# Altium footprint library boxer_mechanical.PcbLib: 38 footprints (part 2 of 3)
Each footprint in its own frame and in the unit in brackets; x right, y up, seen from the top. Pads: shape width x height; smd on the part's side, far side on the other; paste and mask are expansions set on the pad; w line width, h text height; cw(c..) or ccw(c..) is an arc to the next point about the centre after c.
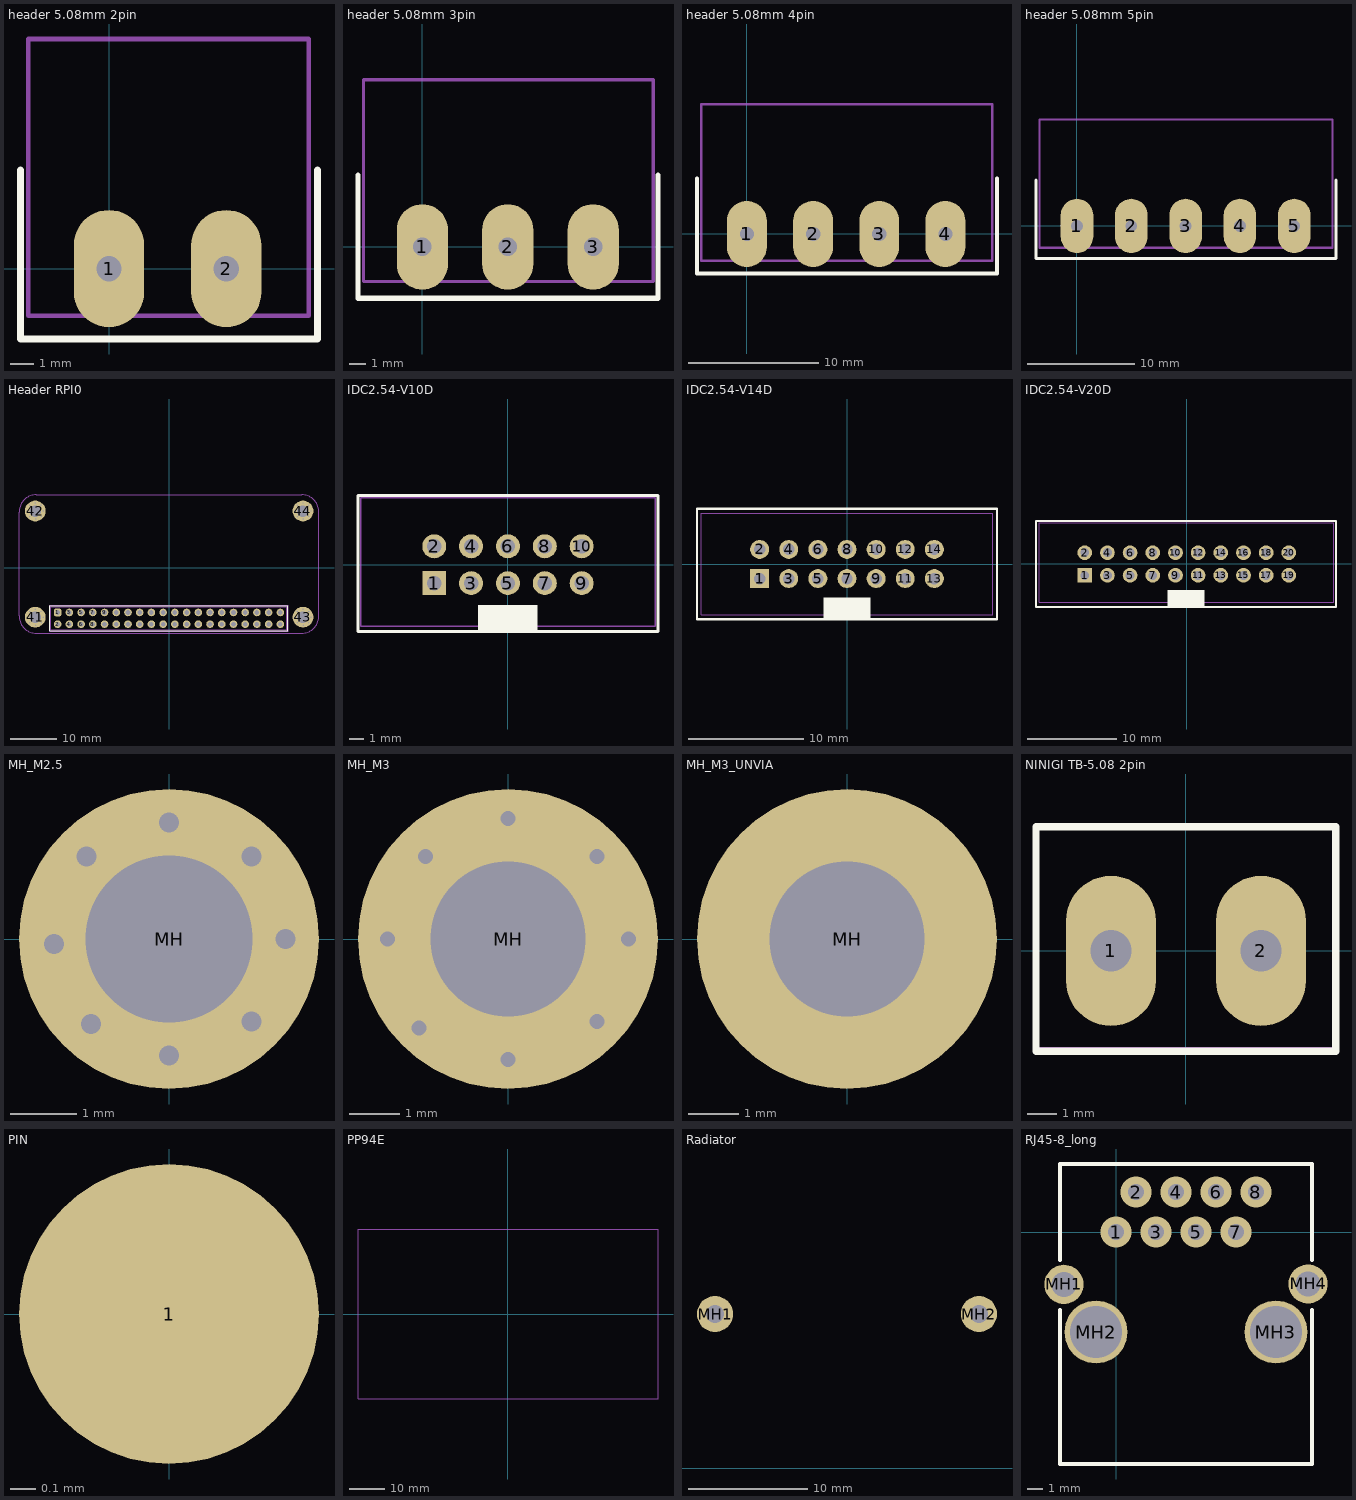
[diagram p1: the footprints below, top view; thin cyan lines are the x and y axes]

## header 5.08mm 2pin [mm]
height 7.8
pads (2):
  oval 3.048x5.08 hole 1.1: 1(0,0) 2(5.08,0)
Top Overlay:
  lines w0.3: -3.833,4.275 -3.833,-3.05 9.03,-3.05 9.03,4.275
Mechanical 13:
  lines w0.2: -3.503,-2.05 8.657,-2.05 8.657,9.95 -3.503,9.95 -3.503,-2.05
3D body "User Library-TB5_08-2R.step": height 8.55, standoff -4.1, extent -3.503,-2.05 8.657,9.95

## header 5.08mm 3pin [mm]
height 7.8
pads (3):
  oval 3.048x5.08 hole 1.1: 1(0,0) 2(5.08,0) 3(10.16,0)
Top Overlay:
  lines w0.254: -1.4,0 0,0 ; 10.16,0 11.56,0
  lines w0.3: -3.833,4.275 -3.833,-3.05 14.017,-3.05 14.017,4.275
Mechanical 13:
  lines w0.2: -3.503,-2.05 13.737,-2.05 13.737,9.95 -3.503,9.95 -3.503,-2.05
3D body "User Library-TB5_08-3R.step": height 8.55, standoff -4.1, extent -3.503,-2.05 13.737,9.95

## header 5.08mm 4pin [mm]
height 7.8
pads (4):
  oval 3.048x5.08 hole 1.1: 1(0,0) 2(5.08,0) 3(10.16,0) 4(15.24,0)
Top Overlay:
  lines w0.254: -1.4,0 0,0 ; 10.16,0 11.56,0
  lines w0.3: -3.833,4.275 -3.833,-3.05 19.2,-3.05 19.2,4.275
Mechanical 13:
  lines w0.2: -3.503,-2.05 18.825,-2.05 18.825,9.95 -3.503,9.95 -3.503,-2.05
3D body "User Library-TB5_08-4R.step": height 8.55, standoff -4.1, extent -3.503,-2.05 18.817,9.95

## header 5.08mm 5pin [mm]
height 7.8
pads (5):
  oval 3.048x5.08 hole 1.1: 1(0,0) 2(5.08,0) 3(10.16,0) 4(15.24,0) 5(20.32,0)
Top Overlay:
  lines w0.254: -1.4,0 0,0 ; 10.16,0 11.56,0
  lines w0.3: -3.833,4.275 -3.833,-3.05 24.225,-3.05 24.225,4.275
Mechanical 13:
  lines w0.2: -3.503,-2.05 23.897,-2.05 23.897,9.95 -3.503,9.95 -3.503,-2.05
3D body "User Library-TB5_08-5R.step": height 8.55, standoff -4.1, extent -3.503,-2.05 23.897,9.95

## Header RPI0 [mm]
height 9.45
pads (44):
  rrect50% 1.65x1.65 hole 1: 1(-24.153,-9.717)
  round 1.65 hole 1: 2(-24.153,-12.257) 3(-21.613,-9.717) 4(-21.613,-12.257) 5(-19.073,-9.717) 6(-19.073,-12.257) 7(-16.533,-9.717) 8(-16.533,-12.257) 9(-13.993,-9.717) 10(-13.993,-12.257) 11(-11.453,-9.717) 12(-11.453,-12.257) 13(-8.913,-9.717) 14(-8.913,-12.257) 15(-6.373,-9.717) 16(-6.373,-12.257) 17(-3.833,-9.717) 18(-3.833,-12.257) 19(-1.293,-9.717) 20(-1.293,-12.257) 21(1.247,-9.717) 22(1.247,-12.257) 23(3.787,-9.717) 24(3.787,-12.257) 25(6.327,-9.717) 26(6.327,-12.257) 27(8.867,-9.717) 28(8.867,-12.257) 29(11.407,-9.717) 30(11.407,-12.257) 31(13.947,-9.717) 32(13.947,-12.257) 33(16.487,-9.717) 34(16.487,-12.257) 35(19.027,-9.717) 36(19.027,-12.257) 37(21.567,-9.717) 38(21.567,-12.257) 39(24.107,-9.717) 40(24.107,-12.257)
  round 4.5 hole 2.5: 41(-29,-10.743) 42(-29,12.257) 43(29,-10.743) 44(29,12.257)
via -30.237,13.494 diameter 0.6 hole 0.3
via -27.727,11.09 diameter 0.6 hole 0.3
via -27.763,13.494 diameter 0.6 hole 0.3
via -30.237,11.019 diameter 0.6 hole 0.3
via -30.75,12.257 diameter 0.6 hole 0.3
via -27.25,12.257 diameter 0.6 hole 0.3
via -28.925,10.532 diameter 0.6 hole 0.3
via -29,14.007 diameter 0.6 hole 0.3
via 29,14.007 diameter 0.6 hole 0.3
via 29.075,10.532 diameter 0.6 hole 0.3
via 30.75,12.257 diameter 0.6 hole 0.3
via 27.25,12.257 diameter 0.6 hole 0.3
via 27.763,11.019 diameter 0.6 hole 0.3
via 30.237,13.494 diameter 0.6 hole 0.3
via 30.273,11.09 diameter 0.6 hole 0.3
via 27.763,13.494 diameter 0.6 hole 0.3
via -29,-8.993 diameter 0.6 hole 0.3
via -28.925,-12.468 diameter 0.6 hole 0.3
via -27.25,-10.743 diameter 0.6 hole 0.3
via -30.75,-10.743 diameter 0.6 hole 0.3
via -30.237,-11.981 diameter 0.6 hole 0.3
via -27.763,-9.506 diameter 0.6 hole 0.3
via -27.727,-11.91 diameter 0.6 hole 0.3
via -30.237,-9.506 diameter 0.6 hole 0.3
via 27.763,-9.506 diameter 0.6 hole 0.3
via 30.273,-11.91 diameter 0.6 hole 0.3
via 30.237,-9.506 diameter 0.6 hole 0.3
via 27.763,-11.981 diameter 0.6 hole 0.3
via 27.25,-10.743 diameter 0.6 hole 0.3
via 30.75,-10.743 diameter 0.6 hole 0.3
via 29.075,-12.468 diameter 0.6 hole 0.3
via 29,-8.993 diameter 0.6 hole 0.3
Top Overlay:
  lines w0.2: -25.823,-13.687 25.702,-13.687 25.702,-8.287 -25.823,-8.287 -25.823,-13.687
Mechanical 1:
  lines w0.1: -32.525,-10.467 ccw(c-28.775,-10.467) -28.775,-14.217 28.725,-14.217 ccw(c28.725,-10.467) 32.475,-10.467 32.475,12.033 ccw(c28.725,12.033) 28.725,15.783 -28.775,15.783 ccw(c-28.775,12.033) -32.525,12.033 -32.525,-10.467
Mechanical 13:
  lines w0.1: -25.603,-13.487 25.497,-13.487 25.497,-8.487 -25.603,-8.487 -25.603,-13.487
  text ".Value" at -0.823,-11.162 h0.5
  text ".Designator" at -25.448,-8.187 h0.5
Mechanical 15:
  lines w0.1: -25.905,-13.787 25.761,-13.787 25.799,-8.187 -25.866,-8.187 -25.905,-13.787
3D body "User Library-Header 2x20 2_54mm.step": height 8.5, standoff -2.6, extent -25.603,-13.512 25.497,-8.512

## IDC2.54-V10D [mm]
height 9.45
pads (10):
  rect 1.65x1.65 hole 1: 1(-5.08,-1.27)
  round 1.65 hole 1: 2(-5.08,1.27) 3(-2.54,-1.27) 4(-2.54,1.27) 5(0,-1.27) 6(0,1.27) 7(2.54,-1.27) 8(2.54,1.27) 9(5.08,-1.27) 10(5.08,1.27)
Top Overlay:
  rectangle: -2.05,-4.675 2.05,-2.775
  lines w0.2: -10.335,-4.6 -10.335,4.775 10.34,4.775 10.34,-4.6 -10.335,-4.6
Mechanical 13:
  lines w0.1: -10.135,-4.25 10.165,-4.25 10.165,4.6 -10.135,4.6 -10.135,-4.25
3D body "User Library-IDC Socket Male 10pin Straight THT Goldplated 2_54mm.step": height 8.93, standoff -3.47, extent -10.135,-4.25 10.165,4.6

## IDC2.54-V14D [mm] "Connector; IDC, Low Profile Male Header, Thru-Hole; 14 Position; Vertical; Pitch 2.54 mm; Body 25.40 x 9.2 x 9.45 mm (LxWxH)"
height 9.45
pads (14):
  rect 1.65x1.65 hole 1: 1(-7.62,-1.27)
  round 1.65 hole 1: 2(-7.62,1.27) 3(-5.08,-1.27) 4(-5.08,1.27) 5(-2.54,-1.27) 6(-2.54,1.27) 7(0,-1.27) 8(0,1.27) 9(2.54,-1.27) 10(2.54,1.27) 11(5.08,-1.27) 12(5.08,1.27) 13(7.62,-1.27) 14(7.62,1.27)
Top Overlay:
  rectangle: -2.032,-4.826 2.068,-2.926
  lines w0.2: -13.081,-4.826 13.081,-4.826 13.081,4.826 -13.081,4.826 -13.081,-4.826
Mechanical 13:
  lines w0.1: -12.7,-4.445 -12.7,4.445 12.7,4.445 12.7,-4.445 -12.7,-4.445
3D body "User Library-IDC Socket Male 14pin Straight THT Goldplated 2_54mm.STEP": height 8.93, standoff -3.47, extent -12.69,-4.405 12.69,4.445

## IDC2.54-V20D [mm] "Connector; IDC, Low Profile Male Header, Thru-Hole; 14 Position; Vertical; Pitch 2.54 mm; Body 25.40 x 9.2 x 9.45 mm (LxWxH)"
height 9.45
pads (20):
  rect 1.65x1.65 hole 1: 1(-11.43,-1.27)
  round 1.65 hole 1: 2(-11.43,1.27) 3(-8.89,-1.27) 4(-8.89,1.27) 5(-6.35,-1.27) 6(-6.35,1.27) 7(-3.81,-1.27) 8(-3.81,1.27) 9(-1.27,-1.27) 10(-1.27,1.27) 11(1.27,-1.27) 12(1.27,1.27) 13(3.81,-1.27) 14(3.81,1.27) 15(6.35,-1.27) 16(6.35,1.27) 17(8.89,-1.27) 18(8.89,1.27) 19(11.43,-1.27) 20(11.43,1.27)
Top Overlay:
  rectangle: -2.138,-4.826 1.962,-2.926
  lines w0.2: -16.891,-4.826 16.715,-4.826 16.715,4.826 -16.891,4.826 -16.891,-4.826
Mechanical 13:
  lines w0.1: -16.5,-4.3 -16.5,4.6 16.475,4.6 16.475,-4.3 -16.5,-4.3
3D body "User Library-IDC Socket Male 20pin Straight THT Goldplated 2_54mm.step": height 8.93, standoff -3.47, extent -16.5,-4.25 16.5,4.6

## MH_M2.5 [mm] "M2.5"
pads (1):
  round 4.5 hole 2.5: MH(0,0)
via 1.237,1.237 diameter 0.6 hole 0.3
via -1.167,-1.273 diameter 0.6 hole 0.3
via 1.237,-1.237 diameter 0.6 hole 0.3
via -1.237,1.237 diameter 0.6 hole 0.3
via 0,1.75 diameter 0.6 hole 0.3
via 0,-1.75 diameter 0.6 hole 0.3
via -1.725,-0.075 diameter 0.6 hole 0.3
via 1.75,0 diameter 0.6 hole 0.3

## MH_M3 [mm] "M3 3mm hole"
pads (1):
  round 6 hole 3.1: MH(0,0)
via 1.778,1.651 diameter 0.6 hole 0.3
via 2.413,0 diameter 0.6 hole 0.3
via 1.778,-1.651 diameter 0.6 hole 0.3
via 0,-2.413 diameter 0.6 hole 0.3
via -1.778,-1.778 diameter 0.6 hole 0.3
via -2.413,0 diameter 0.6 hole 0.3
via -1.651,1.651 diameter 0.6 hole 0.3
via 0,2.413 diameter 0.6 hole 0.3

## MH_M3_UNVIA [mm] "M3 3mm hole"
pads (1):
  round 6 hole 3.1: MH(0,0)

## NINIGI TB-5.08 2pin [mm] "NINIGI TB-5.08-P-2P/BL"
height 10
pads (2):
  oval 3.048x5.08 hole 1.4: 1(-2.54,0) 2(2.54,0)
Top Overlay:
  lines w0.254: -5.08,-3.4 -5.08,4.2 5.08,4.2 5.08,-3.4 -5.08,-3.4
Mechanical 13:
  lines w0.1: -5.08,-3.3 5.08,-3.3 5.08,4.2 -5.08,4.2 -5.08,-3.3
  text ".Value" at -0.95,0.3 h0.5
  text ".Designator" at -5.094,4.518 h0.5
3D body "User Library-Terminal block 2 POS.STEP": height 10, standoff -3.05, extent -5.08,-3.3 5.08,4.2

## PIN [mm] "Test Pad"
pads (1):
  round 1.2 smd: 1(0,0)

## PP94E [mm]
height 25.7
Mechanical 1:
  lines w0.1: -42.75,-24.15 -42.75,24.15 42.75,24.15 42.75,-24.15 -42.75,-24.15
3D body "Tapa PP94 E.STEP": height 24.2, standoff -1.9, extent -42.75,-24.15 42.75,24.15

## Radiator [mm] "RAD-DY-GF/3"
height 15
pads (2):
  round 3.048 hole 1.5: MH1(3.9,13) MH2(26.1,13)

## RJ45-8_long [mm]
pads (12):
  round 2 hole 1: 1(0,0) 2(1.27,2.54) 3(2.54,0) 4(3.81,2.54) 5(5.08,0) 6(6.35,2.54) 7(7.62,0) 8(8.89,2.54)
  round 2.5 hole 1.6: MH1(-3.305,-3.325) MH4(12.195,-3.3)
  round 4 hole 3.3: MH2(-1.27,-6.35) MH3(10.16,-6.35)
Top Overlay:
  lines w0.254: -3.556,-4.953 -3.556,-14.732 12.446,-14.732 12.446,-4.953 ; -3.556,-1.778 -3.556,4.318 12.446,4.318 12.446,-1.778
3D body "User Library-FRJAE-468.step": height 13.98, standoff -3.68, extent -3.255,-14.542 12.145,4.128